# Altium footprint library SMT.PcbLib: 325 footprints (part 11 of 21)
Each footprint in its own frame and in the unit in brackets; x right, y up, seen from the top. Pads: shape width x height; smd on the part's side, far side on the other; paste and mask are expansions set on the pad; w line width, h text height; cw(c..) or ccw(c..) is an arc to the next point about the centre after c.
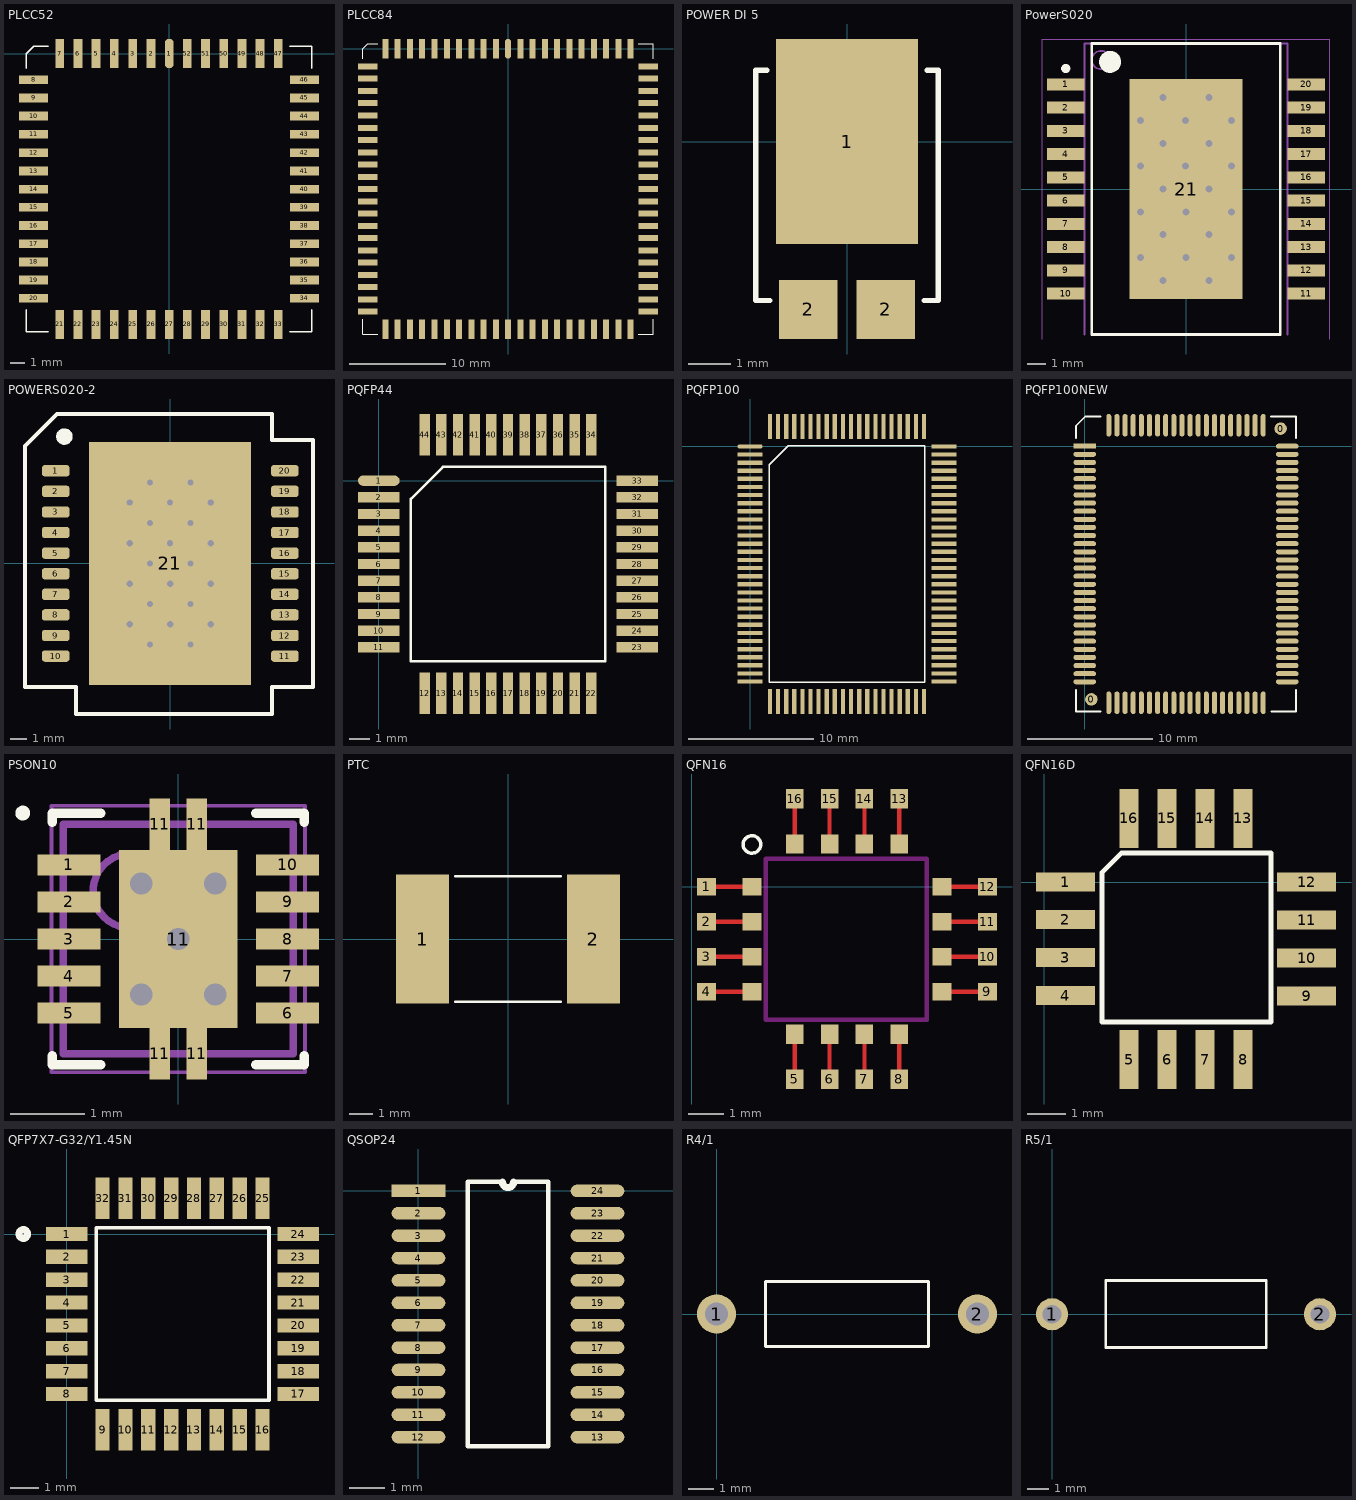
[diagram p10: the footprints below, top view; thin cyan lines are the x and y axes]

## PLCC52 [mil]
pads (52):
  oct 24x80 smd: 1(0,0)
  rect 24x80 smd: 2(-50,0) 3(-100,0) 4(-151,0) 5(-201,0) 6(-251,0) 7(-301,0) 21(-301,-745) 22(-251,-745) 23(-201,-745) 24(-151,-745) 25(-100,-745) 26(-50,-745) 27(0,-745) 28(50,-745) 29(100,-745) 30(150,-745) 31(200,-745) 32(250,-745) 33(300,-745) 47(300,0) 48(250,0) 49(200,0) 50(150,0) 51(100,0) 52(50,0)
  rect 80x24 smd: 8(-373,-72) 9(-373,-122) 10(-373,-172) 11(-373,-222) 12(-373,-273) 13(-373,-323) 14(-373,-373) 15(-373,-423) 16(-373,-473) 17(-373,-523) 18(-373,-573) 19(-373,-623) 20(-373,-673) 34(372,-673) 35(372,-623) 36(372,-573) 37(372,-523) 38(372,-473) 39(372,-423) 40(372,-373) 41(372,-323) 42(372,-273) 43(372,-222) 44(372,-172) 45(372,-122) 46(372,-72)
TopOverlay:
  lines w5: -393,-705 -393,-765 -333,-765 ; -393,-40 -393,0 -373,20 -333,20 ; 332,-765 392,-765 392,-705 ; 332,20 392,20 392,-40

## PLCC84 [mil]
pads (84):
  oct 24x80 smd: 1(0,0)
  rect 24x80 smd: 2(-50,0) 3(-100,0) 4(-150,0) 5(-200,0) 6(-250,0) 7(-300,0) 8(-351,0) 9(-401,0) 10(-451,0) 11(-501,0) 33(-501,-1145) 34(-451,-1145) 35(-401,-1145) 36(-351,-1145) 37(-300,-1145) 38(-250,-1145) 39(-200,-1145) 40(-150,-1145) 41(-100,-1145) 42(-50,-1145) 43(0,-1145) 44(50,-1145) 45(100,-1145) 46(150,-1145) 47(200,-1145) 48(250,-1145) 49(300,-1145) 50(350,-1145) 51(400,-1145) 52(450,-1145) 53(500,-1145) 75(500,0) 76(450,0) 77(400,0) 78(350,0) 79(300,0) 80(250,0) 81(200,0) 82(150,0) 83(100,0) 84(50,0)
  rect 80x24 smd: 12(-573,-72) 13(-573,-122) 14(-573,-172) 15(-573,-222) 16(-573,-273) 17(-573,-323) 18(-573,-373) 19(-573,-423) 20(-573,-473) 21(-573,-523) 22(-573,-573) 23(-573,-623) 24(-573,-673) 25(-573,-723) 26(-573,-773) 27(-573,-823) 28(-573,-873) 29(-573,-923) 30(-573,-973) 31(-573,-1023) 32(-573,-1073) 54(572,-1073) 55(572,-1023) 56(572,-973) 57(572,-923) 58(572,-873) 59(572,-823) 60(572,-773) 61(572,-723) 62(572,-673) 63(572,-623) 64(572,-573) 65(572,-523) 66(572,-473) 67(572,-423) 68(572,-373) 69(572,-323) 70(572,-273) 71(572,-222) 72(572,-172) 73(572,-122) 74(572,-72)
TopOverlay:
  lines w5: -593,-1105 -593,-1165 -533,-1165 ; -593,-40 -593,0 -573,20 -533,20 ; 532,-1165 592,-1165 592,-1105 ; 532,20 592,20 592,-40

## POWER DI 5 [mm]
pads (3):
  rect 3.36x4.86 smd: 1(0,0)
  rect 1.39x1.4 smd: 2(-0.92,-3.982) 2(0.92,-3.982)
TopOverlay:
  lines w0.127: -1.905,1.692 -2.159,1.692 -2.159,-3.769 -1.829,-3.769 ; 1.829,-3.769 2.159,-3.769 2.159,1.692 1.905,1.692
3D body: height 1.15, standoff 0, extent -1.905,-3.769 1.905,1.692

## PowerS020 [mm] "JEDEC MO-166"
height 3.6
pads (21):
  rect 2.05x0.65 smd: 1(-6.575,5.715) 2(-6.575,4.445) 3(-6.575,3.175) 4(-6.575,1.905) 5(-6.575,0.635) 6(-6.575,-0.635) 7(-6.575,-1.905) 8(-6.575,-3.175) 9(-6.575,-4.445) 10(-6.575,-5.715) 11(6.575,-5.715) 12(6.575,-4.445) 13(6.575,-3.175) 14(6.575,-1.905) 15(6.575,-0.635) 16(6.575,0.635) 17(6.575,1.905) 18(6.575,3.175) 19(6.575,4.445) 20(6.575,5.715)
  rect 6.2x12 smd: 21(0,0)
via 1.25,5 diameter 0.762 hole 0.381
via 2.5,3.75 diameter 0.762 hole 0.381
via 1.25,-5 diameter 0.762 hole 0.381
via -1.25,-5 diameter 0.762 hole 0.381
via -0.025,1.25 diameter 0.762 hole 0.381
via 0,-3.75 diameter 0.762 hole 0.381
via -2.5,-3.75 diameter 0.762 hole 0.381
via 1.25,-2.5 diameter 0.762 hole 0.381
via 2.5,-3.75 diameter 0.762 hole 0.381
via 2.5,-1.25 diameter 0.762 hole 0.381
via -1.25,-2.5 diameter 0.762 hole 0.381
via 0,-1.25 diameter 0.762 hole 0.381
via -2.5,-1.25 diameter 0.762 hole 0.381
via -1.25,0 diameter 0.762 hole 0.381
via 1.25,0 diameter 0.762 hole 0.381
via -2.5,1.25 diameter 0.762 hole 0.381
via 2.5,1.25 diameter 0.762 hole 0.381
via 1.25,2.5 diameter 0.762 hole 0.381
via -1.25,2.5 diameter 0.762 hole 0.381
via -0.025,3.75 diameter 0.762 hole 0.381
via -2.5,3.75 diameter 0.762 hole 0.381
via -1.25,5 diameter 0.762 hole 0.381
TopOverlay:
  circle w0.6: c-4.15,6.95 r0.3
  circle w0.25: c-6.575,6.59 r0.125
  lines w0.152: -5.15,-7.95 5.15,-7.95 5.15,7.95 -5.15,7.95 -5.15,-7.95
Mechanical13:
  circle w0.1: c-4.65,7.05 r0.5
  lines w0.1: -5.55,-7.95 -5.55,7.95 5.55,7.95 5.55,-7.95
Mechanical15:
  lines w0.05: -7.85,-8.2 -7.85,8.2 7.85,8.2 7.85,-8.2
3D body "PowerS020.step": height 3.6, standoff 0, extent -7.1,-7.95 7.1,7.95

## POWERS020-2 [mm]
pads (21):
  rrect50% 1.7x0.7 smd: 1(-7.065,5.715) 2(-7.065,4.445) 3(-7.065,3.175) 4(-7.065,1.905) 5(-7.065,0.635) 6(-7.065,-0.635) 7(-7.065,-1.905) 8(-7.065,-3.175) 9(-7.065,-4.445) 10(-7.065,-5.715) 11(7.065,-5.715) 12(7.065,-4.445) 13(7.065,-3.175) 14(7.065,-1.905) 15(7.065,-0.635) 16(7.065,0.635) 17(7.065,1.905) 18(7.065,3.175) 19(7.065,4.445) 20(7.065,5.715)
  rect 10x15 smd: 21(-0.025,0)
via 1.25,5 diameter 0.762 hole 0.381
via 2.5,3.75 diameter 0.762 hole 0.381
via 1.25,-5 diameter 0.762 hole 0.381
via -1.25,-5 diameter 0.762 hole 0.381
via -0.025,1.25 diameter 0.762 hole 0.381
via 0,-3.75 diameter 0.762 hole 0.381
via -2.5,-3.75 diameter 0.762 hole 0.381
via 1.25,-2.5 diameter 0.762 hole 0.381
via 2.5,-3.75 diameter 0.762 hole 0.381
via 2.5,-1.25 diameter 0.762 hole 0.381
via -1.25,-2.5 diameter 0.762 hole 0.381
via 0,-1.25 diameter 0.762 hole 0.381
via -2.5,-1.25 diameter 0.762 hole 0.381
via -1.25,0 diameter 0.762 hole 0.381
via 1.25,0 diameter 0.762 hole 0.381
via -2.5,1.25 diameter 0.762 hole 0.381
via 2.5,1.25 diameter 0.762 hole 0.381
via 1.25,2.5 diameter 0.762 hole 0.381
via -1.25,2.5 diameter 0.762 hole 0.381
via -0.025,3.75 diameter 0.762 hole 0.381
via -2.5,3.75 diameter 0.762 hole 0.381
via -1.25,5 diameter 0.762 hole 0.381
TopOverlay:
  circle w0.254: c-6.532,7.823 r0.381
  circle w0.254: c-6.532,7.823 r0.127
  lines w0.254: -8.97,-7.62 -8.97,-6.477 -8.97,7.239 -6.994,9.215 4.563,9.215 6.27,9.215 6.27,7.62 8.81,7.62 8.81,6.858 8.81,-6.858 8.81,-7.62 6.27,-7.62 6.27,-9.285 -5.815,-9.285 -5.815,-7.62 -8.97,-7.62
3D body "User Library-L298P.STEP": height 3.71, standoff -0.04, extent -7.203,-8 7.297,8

## PQFP44 [mm]
pads (44):
  oval 2x0.5 smd: 1(0,0)
  rect 2x0.5 smd: 2(0,-0.8) 3(0,-1.6) 4(0,-2.4) 5(0,-3.2) 6(0,-4) 7(0,-4.8) 8(0,-5.6) 9(0,-6.4) 10(0,-7.2) 11(0,-8) 23(12.4,-8) 24(12.4,-7.2) 25(12.4,-6.4) 26(12.4,-5.6) 27(12.4,-4.8) 28(12.4,-4) 29(12.4,-3.2) 30(12.4,-2.4) 31(12.4,-1.6) 32(12.4,-0.8) 33(12.4,0)
  rect 0.5x2 smd: 12(2.2,-10.2) 13(3,-10.2) 14(3.8,-10.2) 15(4.6,-10.2) 16(5.4,-10.2) 17(6.2,-10.2) 18(7,-10.2) 19(7.8,-10.2) 20(8.6,-10.2) 21(9.4,-10.2) 22(10.2,-10.2) 34(10.2,2.2) 35(9.4,2.2) 36(8.6,2.2) 37(7.8,2.2) 38(7,2.2) 39(6.2,2.2) 40(5.4,2.2) 41(4.6,2.2) 42(3.8,2.2) 43(3,2.2) 44(2.2,2.2)
TopOverlay:
  lines w0.127: 1.535,-8.665 1.535,-0.87 3.07,0.665 10.865,0.665 10.865,-8.665 1.535,-8.665

## PQFP100 [mm]
pads (100):
  oval 2x0.34 smd: 1(0,0)
  rect 2x0.34 smd: 2(0,-0.65) 3(0,-1.3) 4(0,-1.95) 5(0,-2.6) 6(0,-3.25) 7(0,-3.9) 8(0,-4.55) 9(0,-5.2) 10(0,-5.85) 11(0,-6.5) 12(0,-7.15) 13(0,-7.8) 14(0,-8.45) 15(0,-9.1) 16(0,-9.75) 17(0,-10.4) 18(0,-11.05) 19(0,-11.7) 20(0,-12.35) 21(0,-13) 22(0,-13.65) 23(0,-14.3) 24(0,-14.95) 25(0,-15.6) 26(0,-16.25) 27(0,-16.9) 28(0,-17.55) 29(0,-18.2) 30(0,-18.85) 51(15.55,-18.85) 52(15.55,-18.2) 53(15.55,-17.55) 54(15.55,-16.9) 55(15.55,-16.25) 56(15.55,-15.6) 57(15.55,-14.95) 58(15.55,-14.3) 59(15.55,-13.65) 60(15.55,-13) 61(15.55,-12.35) 62(15.55,-11.7) 63(15.55,-11.05) 64(15.55,-10.4) 65(15.55,-9.75) 66(15.55,-9.1) 67(15.55,-8.45) 68(15.55,-7.8) 69(15.55,-7.15) 70(15.55,-6.5) 71(15.55,-5.85) 72(15.55,-5.2) 73(15.55,-4.55) 74(15.55,-3.9) 75(15.55,-3.25) 76(15.55,-2.6) 77(15.55,-1.95) 78(15.55,-1.3) 79(15.55,-0.65) 80(15.55,0)
  rect 0.34x2 smd: 31(1.6,-20.45) 32(2.25,-20.45) 33(2.9,-20.45) 34(3.55,-20.45) 35(4.2,-20.45) 36(4.85,-20.45) 37(5.5,-20.45) 38(6.15,-20.45) 39(6.8,-20.45) 40(7.45,-20.45) 41(8.1,-20.45) 42(8.75,-20.45) 43(9.4,-20.45) 44(10.05,-20.45) 45(10.7,-20.45) 46(11.35,-20.45) 47(12,-20.45) 48(12.65,-20.45) 49(13.3,-20.45) 50(13.95,-20.45) 81(13.95,1.6) 82(13.3,1.6) 83(12.65,1.6) 84(12,1.6) 85(11.35,1.6) 86(10.7,1.6) 87(10.05,1.6) 88(9.4,1.6) 89(8.75,1.6) 90(8.1,1.6) 91(7.45,1.6) 92(6.8,1.6) 93(6.15,1.6) 94(5.5,1.6) 95(4.85,1.6) 96(4.2,1.6) 97(3.55,1.6) 98(2.9,1.6) 99(2.25,1.6) 100(1.6,1.6)
TopOverlay:
  lines w0.127: 1.535,-18.915 1.535,-1.47 3.07,0.065 14.015,0.065 14.015,-18.915 1.535,-18.915

## PQFP100NEW [mm]
pads (102):
  round 1 smd: 0(0.525,-20.25) 0(15.675,1.4)
  rect 1.8x0.4 smd: 1(0,0)
  oval 1.8x0.4 smd: 2(0,-0.65) 3(0,-1.3) 4(0,-1.95) 5(0,-2.6) 6(0,-3.25) 7(0,-3.9) 8(0,-4.55) 9(0,-5.2) 10(0,-5.85) 11(0,-6.5) 12(0,-7.15) 13(0,-7.8) 14(0,-8.45) 15(0,-9.1) 16(0,-9.75) 17(0,-10.4) 18(0,-11.05) 19(0,-11.7) 20(0,-12.35) 21(0,-13) 22(0,-13.65) 23(0,-14.3) 24(0,-14.95) 25(0,-15.6) 26(0,-16.25) 27(0,-16.9) 28(0,-17.55) 29(0,-18.2) 30(0,-18.85) 51(16.2,-18.85) 52(16.2,-18.2) 53(16.2,-17.55) 54(16.2,-16.9) 55(16.2,-16.25) 56(16.2,-15.6) 57(16.2,-14.95) 58(16.2,-14.3) 59(16.2,-13.65) 60(16.2,-13) 61(16.2,-12.35) 62(16.2,-11.7) 63(16.2,-11.05) 64(16.2,-10.4) 65(16.2,-9.75) 66(16.2,-9.1) 67(16.2,-8.45) 68(16.2,-7.8) 69(16.2,-7.15) 70(16.2,-6.5) 71(16.2,-5.85) 72(16.2,-5.2) 73(16.2,-4.55) 74(16.2,-3.9) 75(16.2,-3.25) 76(16.2,-2.6) 77(16.2,-1.95) 78(16.2,-1.3) 79(16.2,-0.65) 80(16.2,0)
  oval 0.4x1.8 smd: 31(1.925,-20.525) 32(2.575,-20.525) 33(3.225,-20.525) 34(3.875,-20.525) 35(4.525,-20.525) 36(5.175,-20.525) 37(5.825,-20.525) 38(6.475,-20.525) 39(7.125,-20.525) 40(7.775,-20.525) 41(8.425,-20.525) 42(9.075,-20.525) 43(9.725,-20.525) 44(10.375,-20.525) 45(11.025,-20.525) 46(11.675,-20.525) 47(12.325,-20.525) 48(12.975,-20.525) 49(13.625,-20.525) 50(14.275,-20.525) 81(14.275,1.675) 82(13.625,1.675) 83(12.975,1.675) 84(12.325,1.675) 85(11.675,1.675) 86(11.025,1.675) 87(10.375,1.675) 88(9.725,1.675) 89(9.075,1.675) 90(8.425,1.675) 91(7.775,1.675) 92(7.125,1.675) 93(6.475,1.675) 94(5.825,1.675) 95(5.175,1.675) 96(4.525,1.675) 97(3.875,1.675) 98(3.225,1.675) 99(2.575,1.675) 100(1.925,1.675)
TopOverlay:
  lines w0.127: -0.7,-19.5 -0.7,-21.225 1.275,-21.225 ; -0.7,0.65 -0.7,1.625 0.05,2.375 1.275,2.375 ; 14.9,2.375 16.9,2.375 16.9,0.65 ; 14.925,-21.225 16.9,-21.225 16.9,-19.5

## PSON10 [mm] "PSON, 10-Leads, Body 3.00x3.00mm, Pitch 0.50mm, Thermal Pad 2.40x1.49mm, IPC Medium Density"
height 1
pads (15):
  rect 0.85x0.28 smd: 1(-1.475,1) 2(-1.475,0.5) 3(-1.475,0) 4(-1.475,-0.5) 5(-1.475,-1) 6(1.475,-1) 7(1.475,-0.5) 8(1.475,0) 9(1.475,0.5) 10(1.475,1)
  rect 0.28x0.7 smd: 11(-0.25,-1.55) 11(-0.25,1.55) 11(0.25,-1.55) 11(0.25,1.55)
  rect 1.6x2.4 smd: 11(0,0)
via -0.5,-0.75 diameter 0.45 hole 0.3
via 0.5,-0.75 diameter 0.45 hole 0.3
via 0.5,0.75 diameter 0.45 hole 0.3
via -0.5,0.75 diameter 0.45 hole 0.3
via 0,0 diameter 0.45 hole 0.3
TopOverlay:
  circle w0.1: c-2.1,1.7 r0.05
  lines w0.127: -1.7,-1.575 -1.7,-1.7 -1.045,-1.7 ; -1.7,1.575 -1.7,1.7 -1.045,1.7 ; 1.045,-1.7 1.7,-1.7 1.7,-1.575 ; 1.045,1.7 1.7,1.7 1.7,1.575
Mechanical13:
  circle w0.1: c-0.65,0.65 r0.5
  lines w0.1: -1.55,-1.55 1.55,-1.55 1.55,1.55 -1.55,1.55 -1.55,-1.55
Mechanical15:
  lines w0.05: -1.71,-1.8 1.71,-1.8 1.71,1.8 -1.71,1.8 -1.71,-1.8
  lines w0.1: -0.5,0 0.5,0 ; 0,-0.5 0,0.5
3D body: height 1, standoff 0, extent -1.55,-1.55 1.55,1.55

## PTC [mm] "MC33195"
height 1
pads (2):
  rect 2.3x5.6 smd: 1(-3.7,0) 2(3.7,0)
TopOverlay:
  lines w0.127: -2.284,-2.72 0,-2.72 2.284,-2.72 ; -2.284,2.72 0,2.72 2.284,2.72

## QFN16 [mm]
pads (32):
  rect 0.55x0.5 smd: 1(0.424,0) 2(0.424,-1) 3(0.424,-2) 4(0.424,-3) 9(8.456,-3) 10(8.456,-2) 11(8.456,-1) 12(8.456,0) ""(1.72,-3) ""(1.72,-2) ""(1.72,-1) ""(1.72,0) ""(7.16,-3) ""(7.16,-2) ""(7.16,-1) ""(7.16,0)
  rect 0.5x0.55 smd: 5(2.94,-5.506) 6(3.94,-5.506) 7(4.94,-5.506) 8(5.94,-5.506) 13(5.94,2.516) 14(4.94,2.516) 15(3.94,2.516) 16(2.94,2.516) ""(2.94,-4.22) ""(2.94,1.22) ""(3.94,-4.22) ""(3.94,1.22) ""(4.94,-4.22) ""(4.94,1.22) ""(5.94,-4.22) ""(5.94,1.22)
TopLayer:
  lines w0.127: 0.424,-2 1.44,-2 ; 0.424,-1 1.44,-1 ; 0.424,0 1.44,0 ; 0.434,-3 1.45,-3 ; 2.94,-5.506 2.94,-4.49 ; 2.94,1.5 2.94,2.516 ; 3.94,-5.516 3.94,-4.5 ; 3.94,1.5 3.94,2.516 ; 4.94,-5.516 4.94,-4.5 ; 4.94,1.5 4.94,2.516 ; 5.94,-5.516 5.94,-4.5 ; 5.94,1.5 5.94,2.516 ; 7.44,-3 8.456,-3 ; 7.44,-2 8.456,-2 ; 7.44,-1 8.456,-1 ; 7.44,0 8.456,0
TopOverlay:
  circle w0.1: c1.72,1.21 r0.25
KeepOutLayer:
  lines w0.127: 2.12,-3.8 6.72,-3.8 6.72,0.8 2.12,0.8 2.12,-3.8

## QFN16D [mm]
pads (16):
  rect 1.55x0.5 smd: 1(0.559,0) 2(0.559,-0.991) 3(0.559,-1.991) 4(0.559,-2.991) 9(6.909,-3) 10(6.909,-2) 11(6.909,-1) 12(6.909,0)
  rect 0.5x1.55 smd: 5(2.235,-4.674) 6(3.235,-4.674) 7(4.235,-4.674) 8(5.235,-4.674) 13(5.232,1.676) 14(4.232,1.676) 15(3.232,1.676) 16(2.232,1.676)
TopOverlay:
  lines w0.127: 1.524,-3.683 5.969,-3.683 5.969,0.762 2.032,0.762 1.524,0.254 1.524,-3.683

## QFP7X7-G32/Y1.45N [mm]
pads (32):
  rect 1.45x0.5 smd: 1(0,0) 2(0,-0.8) 3(0,-1.6) 4(0,-2.4) 5(0,-3.2) 6(0,-4) 7(0,-4.8) 8(0,-5.6) 17(8.1,-5.6) 18(8.1,-4.8) 19(8.1,-4) 20(8.1,-3.2) 21(8.1,-2.4) 22(8.1,-1.6) 23(8.1,-0.8) 24(8.1,0)
  rect 0.5x1.45 smd: 9(1.25,-6.85) 10(2.05,-6.85) 11(2.85,-6.85) 12(3.65,-6.85) 13(4.45,-6.85) 14(5.25,-6.85) 15(6.05,-6.85) 16(6.85,-6.85) 25(6.85,1.25) 26(6.05,1.25) 27(5.25,1.25) 28(4.45,1.25) 29(3.65,1.25) 30(2.85,1.25) 31(2.05,1.25) 32(1.25,1.25)
TopOverlay:
  circle w0.25: c-1.525,0 r0.15
  lines w0.127: 1.025,-5.825 7.075,-5.825 7.075,0.225 1.025,0.225 1.025,-5.825

## QSOP24 [mil]
pads (24):
  rect 60x14 smd: 1(0,0)
  oval 60x14 smd: 2(0,-25) 3(0,-50) 4(0,-75) 5(0,-100) 6(0,-125) 7(0,-150) 8(0,-175) 9(0,-200) 10(0,-225) 11(0,-250) 12(0,-275) 13(200,-275) 14(200,-250) 15(200,-225) 16(200,-200) 17(200,-175) 18(200,-150) 19(200,-125) 20(200,-100) 21(200,-75) 22(200,-50) 23(200,-25) 24(200,0)
TopOverlay:
  lines w5: 90,10 55,10 55,-285 145,-285 145,10 110,10
  lines w8: 93.75,10 ccw(c100,10) 106.25,10

## R4/1 [mil]
pads (2):
  round 60 hole 35: 1(0,0) 2(400,0)
TopOverlay:
  lines w5: 75,-50 325,-50 325,50 75,50 75,-50

## R5/1 [mil]
pads (2):
  round 60 hole 35: 1(0,0) 2(500,0)
TopOverlay:
  lines w5: 100,-62 400,-62 400,63 100,63 100,-62